# Altium footprint library Tomra_Altium_Footprints.PcbLib: 53 footprints (part 4 of 4)
Each footprint in its own frame and in the unit in brackets; x right, y up, seen from the top. Pads: shape width x height; smd on the part's side, far side on the other; paste and mask are expansions set on the pad; w line width, h text height; cw(c..) or ccw(c..) is an arc to the next point about the centre after c.
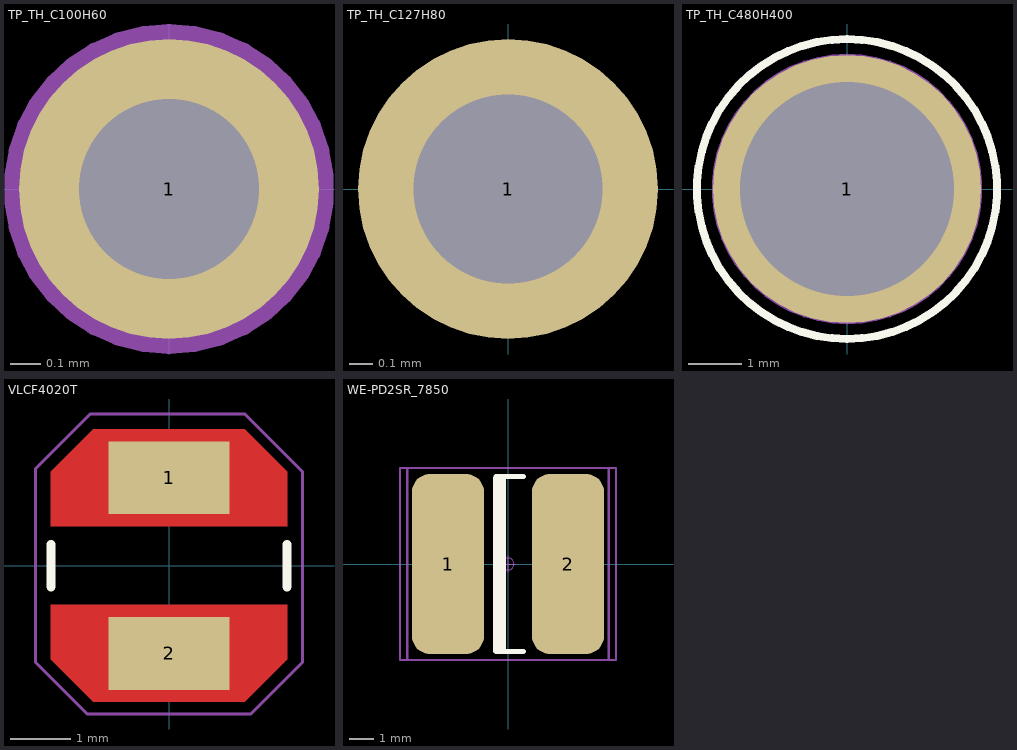
[diagram p3: the footprints below, top view; thin cyan lines are the x and y axes]

## TP_TH_C100H60 [mm]
height 0.1
pads (1):
  round 1 hole 0.6 paste+0 mask+0: 1(0,0)
Mechanical 13:
  lines w0.1: 0,-0.5 cw(c0,0) 0,0.5 cw(c0,0) 0,-0.5
  text ".Designator" at -3.4,-0.6 h1.5
Mechanical 15:
  circle w0.05: c0,0 r0.25
  lines w0.05: -0.35,0 0.35,0 ; 0,-0.35 0,0.35

## TP_TH_C127H80 [mm]
height 0.1
pads (1):
  round 1.27 hole 0.8 paste+0 mask+0: 1(0,0)
Mechanical 13:
  lines w0.1: 0,-0.5 ccw(c0,0) 0,0.5 ccw(c0,0) 0,-0.5
  text ".Designator" at -3.4,-0.6 h1.5
Mechanical 15:
  circle w0.05: c0,0 r0.25
  lines w0.05: -0.35,0 0.35,0 ; 0,-0.35 0,0.35

## TP_TH_C480H400 [mm]
height 0.1
pads (1):
  round 5 / inner round 1.524 / far side round 4.8 hole 4 paste+0 mask+0: 1(0,0)
Top Overlay:
  lines w0.15: 0,-2.8 ccw(c0,0) 0,2.8 ccw(c0,0) 0,-2.8
Mechanical 13:
  lines w0.05: 0,-2.5 ccw(c0,0) 0,2.5 ccw(c0,0) 0,-2.5 ; 0,-2 cw(c0,0) 0,2 cw(c0,0) 0,-2
  text ".Designator" at -3.4,-0.6 h1.5
Mechanical 15:
  circle w0.05: c0,0 r0.25
  lines w0.05: -0.35,0 0.35,0 ; 0,-0.35 0,0.35

## VLCF4020T [mm]
pads (2):
  rect 2x1.2 smd: 1(0,1.45) 2(0,-1.45)
Top Layer:
  region: -1.95,-1.55 -1.25,-2.25 1.25,-2.25 1.95,-1.55 1.95,-0.65 -1.95,-0.65
  region: 1.95,1.55 1.25,2.25 -1.25,2.25 -1.95,1.55 -1.95,0.65 1.95,0.65
Top Overlay:
  lines w0.15: -1.95,-0.35 -1.95,0.35 ; 1.95,-0.35 1.95,0.35
Mechanical 15:
  lines w0.05: -2.2,-1.6 -2.2,1.6 -1.3,2.5 1.25,2.5 2.2,1.55 2.2,-1.6 1.35,-2.45 -1.35,-2.45 -2.2,-1.6
3D body: height 0.5, standoff 0, extent -1,-2.05 1,-2
3D body: height 0.5, standoff 0, extent -0.975,2 1.025,2.05
3D body: height 2, standoff 0, extent -2,-2 2,2

## WE-PD2SR_7850 [mm] "Chip Inductor, 2-Leads, Body 7.8x7.0mm, IPC Medium Density"
height 5
pads (2):
  rrect50% 3x7.5 smd: 1(-2.5,0) 2(2.5,0)
Top Overlay:
  rectangle: -0.635,-3.683 -0.085,3.617
  lines w0.2: 0.65,-3.65 -0.508,-3.65 -0.508,3.65 0.65,3.65
Mechanical 13:
  lines w0.1: -4.2,-4 -4.2,4 4.2,4 4.2,-4 -4.2,-4
  text ".Designator" at -3.4,-0.6 h1.5
Mechanical 15:
  circle w0.05: c0,0 r0.25
  lines w0.05: -0.35,0 0.35,0 ; 0,-0.35 0,0.35
  lines w0.1: -4.5,-4 -4.5,4 4.5,4 4.5,-4 -4.5,-4
3D body "744787xxx.stp": height 5, standoff 0, extent -3.9,-3.5 3.9,3.5